# Altium footprint library THU.PcbLib: 477 footprints (part 11 of 30)
Each footprint in its own frame and in the unit in brackets; x right, y up, seen from the top. Pads: shape width x height; smd on the part's side, far side on the other; paste and mask are expansions set on the pad; w line width, h text height; cw(c..) or ccw(c..) is an arc to the next point about the centre after c.
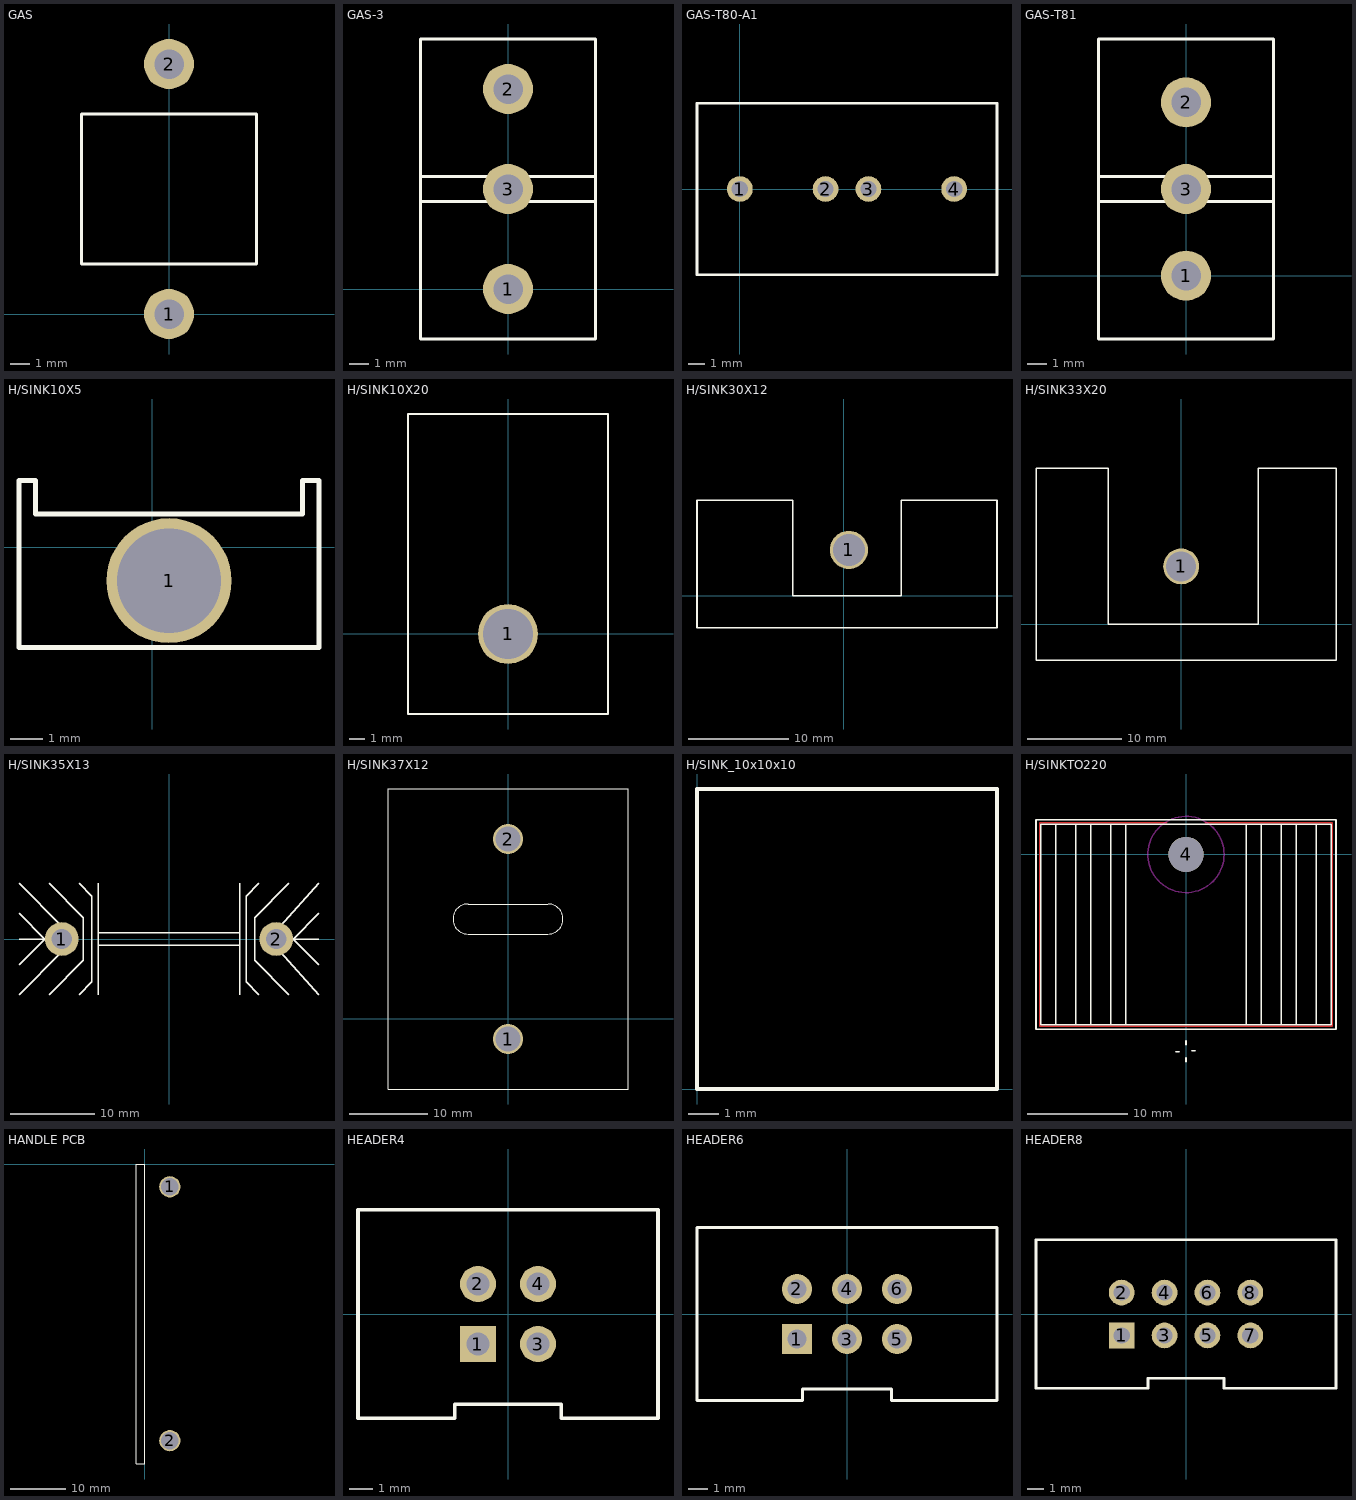
[diagram p10: the footprints below, top view; thin cyan lines are the x and y axes]

## GAS [mil]
pads (2):
  round 100 hole 59: 1(0,0) 2(0,500)
TopOverlay:
  lines w6: -175,100 -175,400 175,400 175,100 -175,100

## GAS-3 [mil]
pads (3):
  round 100 hole 59: 1(0,0) 2(0,400) 3(0,200)
TopOverlay:
  lines w6: -175,175 175,175 ; -175,225 175,225 ; -175,-100 -175,500 175,500 175,-100 -175,-100

## GAS-T80-A1 [mil]
pads (4):
  round 60 hole 38: 1(0,0) 2(200,0) 3(300,0) 4(500,0)
TopOverlay:
  lines w6: -100,-200 -100,200 600,200 600,-200 -100,-200

## GAS-T81 [mil]
pads (3):
  round 100 hole 59: 1(0,0) 2(0,346.46) 3(0,173.23)
TopOverlay:
  lines w6: -175,148.23 175,148.23 ; -175,198.23 175,198.23 ; -175,-126.77 175,-126.77 175,473.23 -175,473.23 -175,-126.77

## H/SINK10X5 [mil]
pads (1):
  round 150 hole 125: 1(20,-40)
TopOverlay:
  lines w6: -160,-120 -160,80 -140,80 -140,40 180,40 180,80 200,80 200,-120 -160,-120

## H/SINK10X20 [mil]
pads (1):
  round 150 hole 125: 1(0,0)
TopOverlay:
  lines w6: -250,-200 250,-200 250,550 -250,550 -250,-200

## H/SINK30X12 [mil]
pads (1):
  round 150 hole 125: 1(20,180)
TopOverlay:
  lines w6: -575,-125 -575,375 -200,375 -200,0 225,0 225,375 600,375 600,-125 -575,-125

## H/SINK33X20 [mil]
pads (1):
  round 150 hole 125: 1(0,240)
TopOverlay:
  lines w6: -605,-150 645,-150 645,650 320,650 320,0 -305,0 -305,650 -605,650 -605,-150

## H/SINK35X13 [mm]
pads (2):
  round 4 hole 2.4: 1(-12.7,0) 2(12.7,0)
TopOverlay:
  lines w0.152: -17.78,-6.604 -12.7,-1.524 ; -17.78,-3.048 -14.732,0 -17.78,3.048 ; -17.78,0 -14.224,0 ; -17.78,6.604 -12.7,1.524 ; -14.224,-6.604 -10.16,-2.54 -10.16,0 -10.16,2.54 -14.224,6.604 ; -10.668,-6.604 -9.144,-5.08 -9.144,0 -9.144,5.08 -10.668,6.604 ; -8.382,-6.604 -8.382,6.604 ; -8.382,-0.75 8.382,-0.75 ; -8.382,0.75 8.382,0.75 ; 8.382,-6.604 8.382,6.604 ; 10.668,-6.604 9.144,-5.08 9.144,0 9.144,5.08 10.668,6.604 ; 13.208,-1.524 17.78,-6.604 ; 13.208,1.524 17.78,6.604 ; 14.224,-6.604 10.16,-2.54 10.16,0 10.16,2.54 14.224,6.604 ; 14.224,0 17.78,0 ; 17.78,-3.048 14.732,0 17.78,3.048

## H/SINK37X12 [mil]
pads (2):
  round 150 hole 125: 1(0,-100) 2(0,900)
TopOverlay:
  lines w6: -600,-350 -600,1150 600,1150 600,-350 -600,-350 ; -200,425 cw(c-200,500) -200,575 200,575 cw(c200,500) 200,425 -200,425

## H/SINK_10x10x10 [mil] "Mini PLCC Chip Adhesive Backed Heatsink - 10 x 10 x 10mm"
height 393.7
TopOverlay:
  lines w5: 0,0 393.7,0 393.7,393.7 0,393.7 0,0
3D body: height 522.44, standoff 128.74, extent 0,0 49.21,393.7
3D body: height 128.74, standoff 50, extent 0,0 393.7,393.7
3D body: height 522.44, standoff 128.74, extent 344.49,0 393.7,393.7
3D body: height 522.44, standoff 128.74, extent 226.38,0 275.59,393.7
3D body: height 522.44, standoff 128.74, extent 118.11,0 167.32,393.7

## H/SINKTO220 [mil]
pads (1):
  round 138 hole 138 unplated: 4(0,0)
TopLayer:
  lines w6: -75,125 -575,125 -575,-675 575,-675 575,125 75,125
TopOverlay:
  lines w6: -511.81,-669.29 -511.81,118.11 ; -433.07,-669.29 -433.07,118.11 ; -374.02,-669.29 -374.02,118.11 ; -295.28,-669.29 -295.28,118.11 ; -236.22,-669.29 -236.22,118.11 ; -39.37,-775.59 -27.56,-775.59 ; 0,-814.96 0,-799.21 ; 0,-748.03 0,-732.28 ; 23.62,-771.65 35.43,-771.65 ; 236.22,-669.29 236.22,118.11 ; 295.28,-669.29 295.28,118.11 ; 374.02,-669.29 374.02,118.11 ; 433.07,-669.29 433.07,118.11 ; 511.81,-669.29 511.81,118.11 ; -590,-687.5 590,-687.5 590,137.5 -590,137.5 -590,-687.5 ; -570.87,-669.29 -570.87,118.11 570.87,118.11 570.87,-669.29 -570.87,-669.29
KeepOutLayer:
  circle w6: c0,0 r150

## HANDLE PCB [mm]
pads (2):
  round 3.81 hole 3.175: 1(4.5,-4.1) 2(4.5,-49.8)
TopOverlay:
  lines w0.152: -1.5,-54 0,-54 0,0 -1.5,0 -1.5,-54
BottomOverlay:
  lines w0.152: 0,-54 10.2,-54 10.2,0 0,0

## HEADER4 [mil]
pads (4):
  rect 60x60 hole 38: 1(-50,-50)
  round 60 hole 38: 2(-50,50) 3(50,-50) 4(50,50)
TopOverlay:
  lines w6: -88.58,-173.23 -249.61,-173.23 -249.61,173.23 249.61,173.23 249.61,-173.23 88.58,-173.23 ; -88.58,-171.81 -88.58,-150 88.58,-150 88.58,-171.81

## HEADER6 [mil]
pads (6):
  rect 60x60 hole 38: 1(-100,-50)
  round 60 hole 38: 2(-100,50) 3(0,-50) 4(0,50) 5(100,-50) 6(100,50)
TopOverlay:
  lines w6: -88.58,-173.23 -299.61,-173.23 -299.61,173.23 299.61,173.23 299.61,-173.23 88.58,-173.23 ; -88.58,-171.81 -88.58,-150 88.58,-150 88.58,-171.81

## HEADER8 [mil]
pads (8):
  rect 60x60 hole 38: 1(-150,-50)
  round 60 hole 38: 2(-150,50) 3(-50,-50) 4(-50,50) 5(50,-50) 6(50,50) 7(150,-50) 8(150,50)
TopOverlay:
  lines w6: -88.58,-173.23 -349.61,-173.23 -349.61,173.23 349.61,173.23 349.61,-173.23 88.58,-173.23 ; -88.58,-171.81 -88.58,-150 88.58,-150 88.58,-171.81